# Altium schematic symbol library IC_ADI.SCHLIB: 3169 symbols (part 23 of 181)
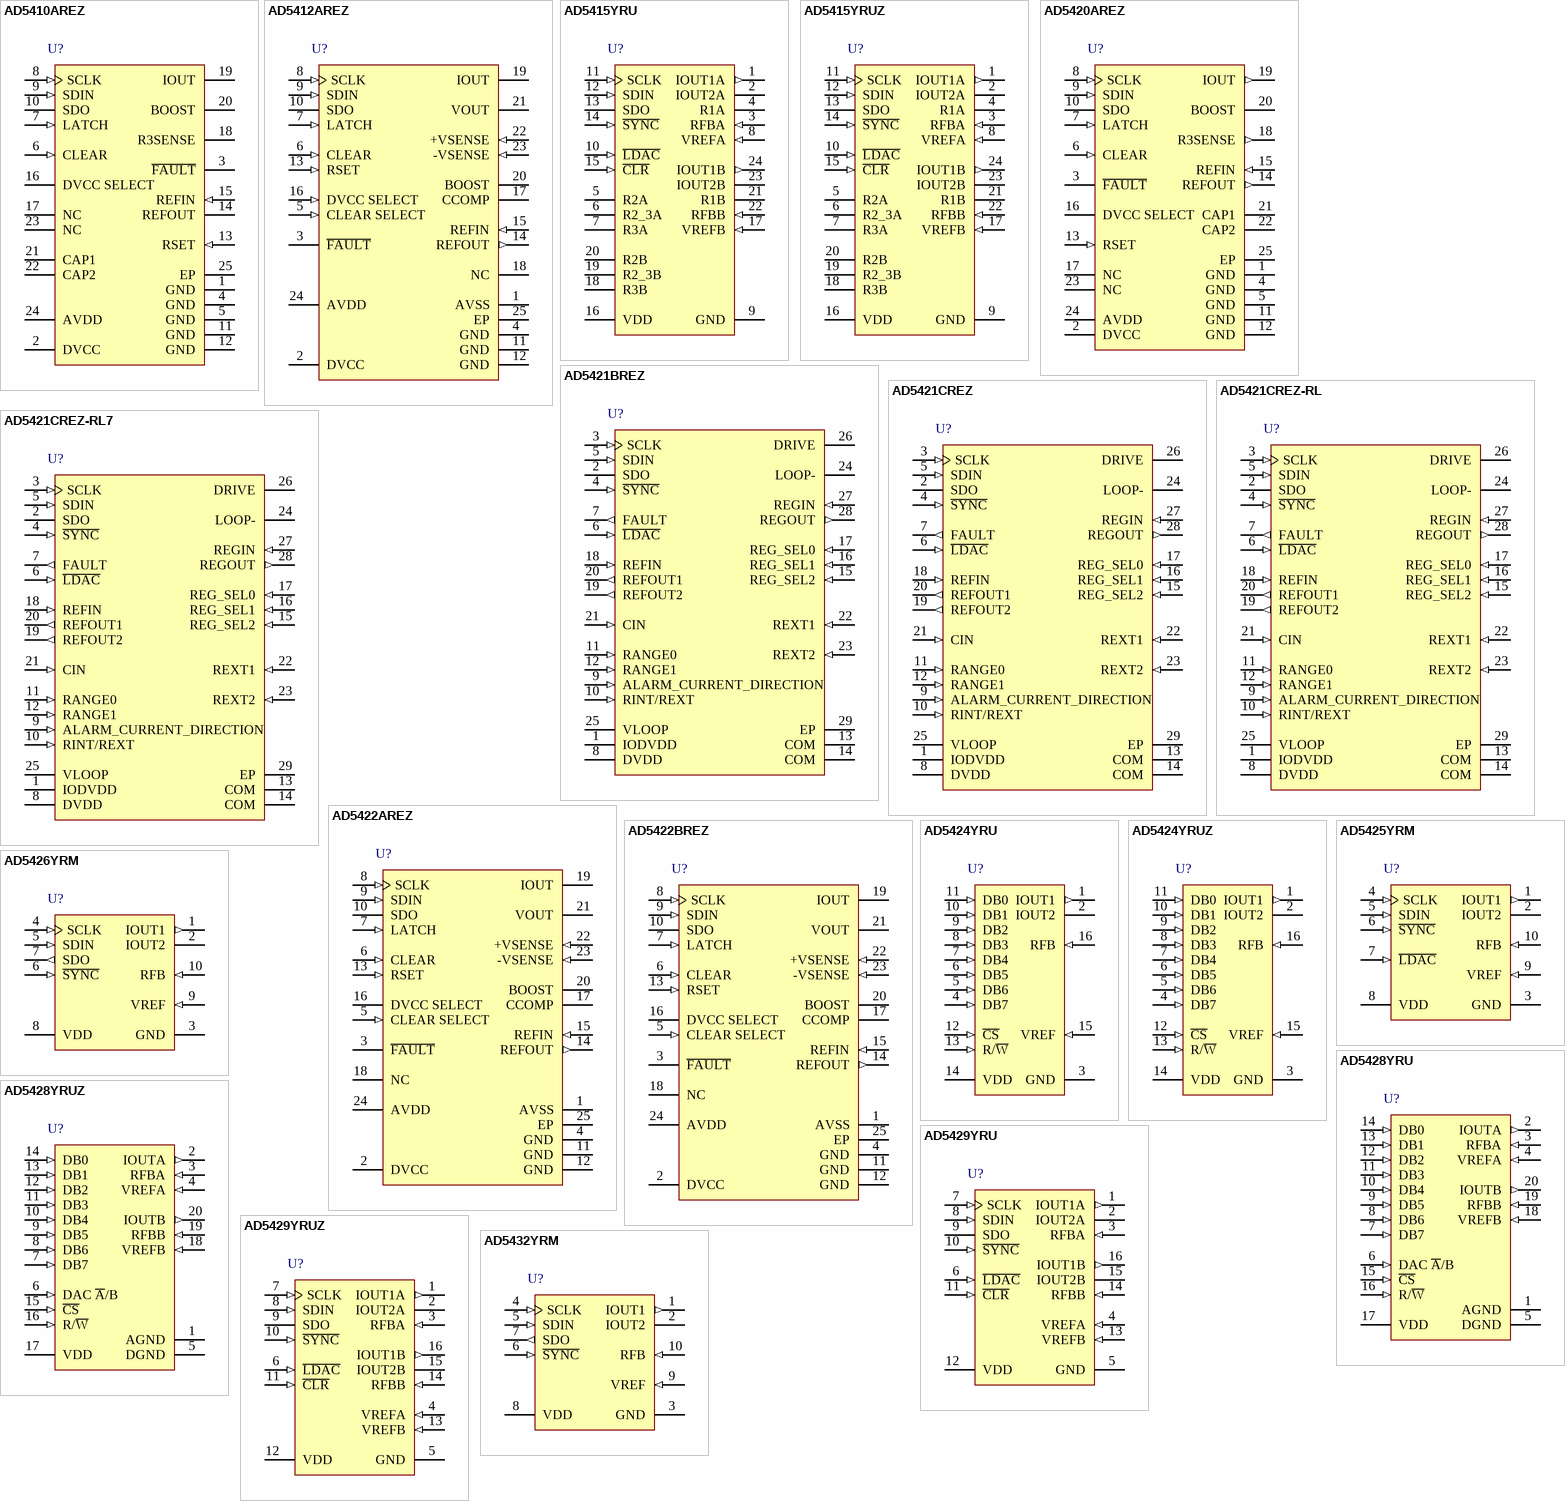
[diagram p213: symbols AD5410AREZ to AD5432YRM]

## AD5415YRU
designator U?
Dual 12-Bit High Bandwidth Multiplying Digital-to-Analog Converter, -40 to +125 degC, RU-24, Tube; Generic Part Number: AD5415; PartNumber: AD5415YRU; # DAC Outputs: 2; Max V+: 5.5V; Op Pwr Diss: 3.5礧; Resolution (Bits): 12; Settling Time: 120ns; Single Supply: Yes; DatasheetVersion: Rev. D; PackageVersion: 2002; PackageReference: RU-24; PackageDescription: 24-Lead Thin Shrink Small Outline Package [TSSOP]; Supplier Part Number 1: AD5415YRU-ND; Supplier Part Number 2: 584-AD5415YRU; Packing: Tube; RoHS: N; Mounting Technology: Surface Mount; Code_JEDEC: MO-153-AD; ComponentLink1Description: Manufacturer URL; ComponentLink2Description: Datasheet; ComponentLink3Description: Package Specification; ComponentLink4Description: Product URL
footprint TSSOP24_0.65 (Footprint not found)
pins: 1 IOUT1A (out) "DAC A Current Output.", 2 IOUT2A "DAC A Analog Ground. This pin should normally be tied to the analog ground of the system, but can be biased to achieve single-supply operation.", 3 RFBA (in) "DAC Feedback Resistor Pin. This pin establishes voltage output for the DAC by connecting to an external amplifier output.", 4 R1A "DAC A 4-Quadrant Resistors. These pins allow a number of configuration modes, including bipolar operation, with minimum external components.", 5 R2A "DAC A 4-Quadrant Resistors. These pins allow a number of configuration modes, including bipolar operation, with minimum external components.", 6 R2_3A "DAC A 4-Quadrant Resistors. These pins allow a number of configuration modes, including bipolar operation, with minimum external components.", 7 R3A "DAC A 4-Quadrant Resistors. These pins allow a number of configuration modes, including bipolar operation, with minimum external components.", 8 VREFA (in) "DAC A Reference Voltage Input Pin.", 9 GND (power) "Ground Pin.", 10 ~{LDAC} (in) "Load DAC Input. This pin allows asynchronous or synchronous updates to the DAC output. The DAC is asynchronously updated when this signal goes low. Alternatively, if this line is held permanently low, an automatic or (See Datasheet)", 11 SCLK (in) "Serial Clock Input. By default, data is clocked into the input shift register on the falling edge of the serial clock input. Alternatively, by means of the serial control bits, the device can be configured such that data is (See Datasheet)", 12 SDIN (in) "Serial Data Input. Data is clocked into the 16-bit input register on the active edge of the serial clock input. By default, on power-up data is clocked into the shift register on the falling edge of SCLK. The control bits (See Datasheet)", 13 SDO (oc) "Serial Data Output. This pin allows a number of parts to be daisy-chained. By default, data is clocked into the shift register on the falling edge and clocked out via SDO on the rising edge of SCLK. Data is always clocked (See Datasheet)", 14 ~{SYNC} (in) "Active Low Control Input. This pin provides the frame synchronization signal for the input data. When S\Y\N\C\ goes low, it powers on the SCLK and SDIN buffers, and the input shift register is enabled. Data is loaded into (See Datasheet)", 15 ~{CLR} (in) "Active Low Control Input. This pin clears the DAC output, input, and DAC registers. Configuration mode allows the user to enable the hardware C\L\R\ pin as a clear to zero scale or midscale as required.", 16 VDD (power) "Positive Power Supply Input. This part can be operated from a supply of 2.5 V to 5.5 V.", 17 VREFB (in) "DAC B Reference Voltage Input Pin.", 18 R3B "DAC B 4-Quadrant Resistors. These pins allow a number of configuration modes, including bipolar operation, with a minimum of external components.", 19 R2_3B "DAC B 4-Quadrant Resistors. These pins allow a number of configuration modes, including bipolar operation, with a minimum of external components.", 20 R2B "DAC B 4-Quadrant Resistors. These pins allow a number of configuration modes, including bipolar operation, with a minimum of external components.", 21 R1B "DAC B 4-Quadrant Resistors. These pins allow a number of configuration modes, including bipolar operation, with a minimum of external components.", 22 RFBB (in) "DAC B Feedback Resistor Pin. This pin establishes voltage output for the DAC by connecting to the external amplifier output.", 23 IOUT2B "DAC B Analog Ground. This pin should normally be tied to the analog ground of the system, but can be biased to achieve single-supply operation.", 24 IOUT1B (out) "DAC B Current Output."

## AD5415YRUZ
designator U?
Dual 12-Bit High Bandwidth Multiplying Digital-to-Analog Converter, -40 to +125 degC, RU-24, Pb-Free, Tube; Generic Part Number: AD5415; PartNumber: AD5415YRUZ; # DAC Outputs: 2; Max V+: 5.5V; Op Pwr Diss: 3.5礧; Resolution (Bits): 12; Settling Time: 120ns; Single Supply: Yes; DatasheetVersion: Rev. D; PackageVersion: 2002; PackageReference: RU-24; PackageDescription: 24-Lead Thin Shrink Small Outline Package [TSSOP]; Supplier Part Number 1: AD5415YRUZ-ND; Supplier Part Number 2: 59K4105; Supplier Part Number 3: 584-AD5415YRUZ; Packing: Tube; RoHS: Y; Mounting Technology: Surface Mount; Code_JEDEC: MO-153-AD; ComponentLink1Description: Manufacturer URL; ComponentLink2Description: Datasheet; ComponentLink3Description: Package Specification; ComponentLink4Description: Product URL
footprint TSSOP24_0.65 (Footprint not found)
pins: 1 IOUT1A (out) "DAC A Current Output.", 2 IOUT2A "DAC A Analog Ground. This pin should normally be tied to the analog ground of the system, but can be biased to achieve single-supply operation.", 3 RFBA (in) "DAC Feedback Resistor Pin. This pin establishes voltage output for the DAC by connecting to an external amplifier output.", 4 R1A "DAC A 4-Quadrant Resistors. These pins allow a number of configuration modes, including bipolar operation, with minimum external components.", 5 R2A "DAC A 4-Quadrant Resistors. These pins allow a number of configuration modes, including bipolar operation, with minimum external components.", 6 R2_3A "DAC A 4-Quadrant Resistors. These pins allow a number of configuration modes, including bipolar operation, with minimum external components.", 7 R3A "DAC A 4-Quadrant Resistors. These pins allow a number of configuration modes, including bipolar operation, with minimum external components.", 8 VREFA (in) "DAC A Reference Voltage Input Pin.", 9 GND (power) "Ground Pin.", 10 ~{LDAC} (in) "Load DAC Input. This pin allows asynchronous or synchronous updates to the DAC output. The DAC is asynchronously updated when this signal goes low. Alternatively, if this line is held permanently low, an automatic or (See Datasheet)", 11 SCLK (in) "Serial Clock Input. By default, data is clocked into the input shift register on the falling edge of the serial clock input. Alternatively, by means of the serial control bits, the device can be configured such that data is (See Datasheet)", 12 SDIN (in) "Serial Data Input. Data is clocked into the 16-bit input register on the active edge of the serial clock input. By default, on power-up data is clocked into the shift register on the falling edge of SCLK. The control bits (See Datasheet)", 13 SDO (oc) "Serial Data Output. This pin allows a number of parts to be daisy-chained. By default, data is clocked into the shift register on the falling edge and clocked out via SDO on the rising edge of SCLK. Data is always clocked (See Datasheet)", 14 ~{SYNC} (in) "Active Low Control Input. This pin provides the frame synchronization signal for the input data. When S\Y\N\C\ goes low, it powers on the SCLK and SDIN buffers, and the input shift register is enabled. Data is loaded into (See Datasheet)", 15 ~{CLR} (in) "Active Low Control Input. This pin clears the DAC output, input, and DAC registers. Configuration mode allows the user to enable the hardware C\L\R\ pin as a clear to zero scale or midscale as required.", 16 VDD (power) "Positive Power Supply Input. This part can be operated from a supply of 2.5 V to 5.5 V.", 17 VREFB (in) "DAC B Reference Voltage Input Pin.", 18 R3B "DAC B 4-Quadrant Resistors. These pins allow a number of configuration modes, including bipolar operation, with a minimum of external components.", 19 R2_3B "DAC B 4-Quadrant Resistors. These pins allow a number of configuration modes, including bipolar operation, with a minimum of external components.", 20 R2B "DAC B 4-Quadrant Resistors. These pins allow a number of configuration modes, including bipolar operation, with a minimum of external components.", 21 R1B "DAC B 4-Quadrant Resistors. These pins allow a number of configuration modes, including bipolar operation, with a minimum of external components.", 22 RFBB (in) "DAC B Feedback Resistor Pin. This pin establishes voltage output for the DAC by connecting to the external amplifier output.", 23 IOUT2B "DAC B Analog Ground. This pin should normally be tied to the analog ground of the system, but can be biased to achieve single-supply operation.", 24 IOUT1B (out) "DAC B Current Output."

## AD5420AREZ
designator U?
Single 16-Bit Current Source Digital-to-Analog Converter with Serial Interface and HART Connectivity, 4 to 20 mA, -40 to +85 degC, RE-24, Pb-Free, Tube; Generic Part Number: AD5420; PartNumber: AD5420AREZ; # DAC Outputs: 1; Max V+: 60V; Resolution (Bits): 16; DatasheetVersion: Rev.D; PackageVersion: 050806-A; PackageReference: RE-24; PackageDescription: 24-Lead Thin Shrink Small Outline Package, Exposed Pad [TSSOP_EP]; Supplier Part Number 1: AD5420AREZ-ND; Supplier Part Number 2: 1827276; Supplier Part Number 3: 05R6577; Supplier Part Number 4: 584-AD5420AREZ; Packing: Tube; RoHS: Y; Mounting Technology: Surface Mount; Code_JEDEC: MO-153-ADT; ComponentLink1Description: Manufacturer URL; ComponentLink2Description: Datasheet; ComponentLink3Description: Package Specification; ComponentLink4Description: Product URL; ComponentLink5Description: Reference Design URL
footprint TSSOP24_0.65-PAD (Footprint not found)
pins: 1 GND (power) "These pins must be connected to ground.", 2 DVCC (power) "Digital Supply Pin. Voltage ranges from 2.7 V to 5.5 V.", 3 ~{FAULT} (oc) "Fault Alert. This pin is asserted low when an open circuit is detected between IOUT and GND or an overtemperature is detected. The F\A\U\L\T\ pin is an open-drain output and must be connected to DVCC through a pull-up (See Datasheet)", 4 GND (power) "These pins must be connected to ground.", 5 GND (power) "These pins must be connected to ground.", 6 CLEAR (in) "Active High Input. Asserting this pin sets the output current to the zero-scale value, which is either 0 mA or 4 mA, depending on the output range programmed, that is, 0 mA to 20 mA, 0 mA to 24 mA, or 4 mA to 20 mA.", 7 LATCH (in) "Positive Edge Sensitive Latch. A rising edge parallel loads the input shift register data into the relevant register. In the case of the data register, the output current is also updated.", 8 SCLK (in) "Serial Clock Input. Data is clocked into the input shift register on the rising edge of SCLK. This operates at clock speeds of up to 30 MHz.", 9 SDIN (in) "Serial Data Input. Data must be valid on the rising edge of SCLK.", 10 SDO (hiz) "Serial Data Output. This pin is used to clock data from the device in daisy-chain or readback mode. Data is clocked out on the falling edge of SCLK. See Figure 3 and Figure 4.", 11 GND (power) "Ground Reference Pin.", 12 GND (power) "These pins must be connected to ground.", 13 RSET (in) "An external, precision, low drift 15 k ohm current setting resistor can be connected to this pin to improve the overall performance of the device. See the Specifications and AD5420 Features sections.", 14 REFOUT (out) "Internal Reference Voltage Output. VREFOUT = 5 V +/- 5 mV at TA = 25degC. Typical temperature drift is 1.8 ppm/degC.", 15 REFIN (in) "External Reference Voltage Input. VREFIN = 5 V +/- 50 mV for specified performance.", 16 DVCC SELECT "This pin, when connected to GND, disables the internal supply, and an external supply must be connected to the DVCC pin. Leave this pin unconnected to enable the internal supply. See the AD5420 Features section.", 17 NC "Do not connect to these pins.", 18 R3SENSE (out) "The voltage measured between this pin and the BOOST pin is directly proportional to the output current and can be used as a monitor/feedback feature. This should be used as a voltage sense output only; current should not be (See Datasheet)", 19 IOUT (out) "Current Output Pin.", 20 BOOST "Optional External Transistor Connection. Connecting an external transistor reduces the power dissipated in the AD5420. See the AD5420 Features section.", 21 CAP1 "Connection for Optional Output Filtering Capacitor. See the AD5420 Features section.", 22 CAP2 "Connection for Optional Output Filtering Capacitor. See the AD5420 Features section. Also HART Input Connection, see Device Features Section.", 23 NC "Do not connect to these pins.", 24 AVDD (power) "Positive Analog Supply Pin. Voltage ranges from 10.8 V to 40 V.", 25 EP (power) "Ground Reference Connection. It is recommended that the exposed pad be thermally connected to a copper plane for enhanced thermal performance."

## AD5421BREZ
designator U?
Single 16-Bit Loop-Powered Digital-to-Analog Converter with Serial Interface, 4 to 20 mA, -40 to +105 degC, RE-28-2, Pb-Free, Tube; Generic Part Number: AD5421; PartNumber: AD5421BREZ; # DAC Outputs: 1; Max V+: 52V; Op Pwr Diss: 1.43mW; Resolution (Bits): 16; Settling Time: 50祍; Single Supply: Yes; DatasheetVersion: Rev.D; PackageVersion: May-2006; PackageReference: RE-28-2; PackageDescription: 28-Lead Thin Shrink Small Outline with Exposed Pad [TSSOP_EP]; Supplier Part Number 1: AD5421BREZ-ND; Supplier Part Number 2: 2081038; Supplier Part Number 3: 27T3838; Supplier Part Number 4: 83T2171; Supplier Part Number 5: 584-AD5421BREZ; Packing: Tube; RoHS: Y; Mounting Technology: Surface Mount; Code_JEDEC: MO-153-AET; ComponentLink1Description: Manufacturer URL; ComponentLink2Description: Datasheet; ComponentLink3Description: Package Specification; ComponentLink4Description: Product URL
footprint TSSOP28_0.65-PAD (Footprint not found)
pins: 1 IODVDD (power) "Digital Interface Supply Pin. Digital thresholds are referenced to the voltage applied to this pin. A voltage from 1.71 V to 5.5 V can be applied to this pin.", 2 SDO (hiz) "Serial Data Output. Used to clock data from the input shift register. Data is clocked out on the rising edge of SCLK and is valid on the falling edge of SCLK.", 3 SCLK (in) "Serial Clock Input. Data is clocked into the input shift register on the falling edge of SCLK. This input operates at clock speeds up to 30 MHz.", 4 ~{SYNC} (in) "Frame Synchronization Input, Active Low. This is the frame synchronization signal for the serial interface. When S\Y\N\C\ is low, data is transferred on the falling edge of SCLK. The input shift register data is latched on (See Datasheet)", 5 SDIN (in) "Serial Data Input. Data must be valid on the falling edge of SCLK.", 6 ~{LDAC} (in) "Load DAC Input, Active Low. This pin is used to update the DAC register and, consequently, the output current. If L\D\A\C\ is tied permanently low, the DAC register is updated on the rising edge of S\Y\N\C\. If L\D\A\C\ is (See Datasheet)", 7 FAULT (out) "Fault Alert Output Pin, Active High. This pin is asserted high when a fault is detected. Detectable faults are loss of SPI interface control, communication error (PEC), loop current out of range, insufficient loop voltage, (See Datasheet)", 8 DVDD (power) "3.3 V Digital Power Supply Output. This pin should be decoupled to COM with 100 nF and 4.7 uF capacitors.", 9 ALARM_CURRENT_DIRECTION (in) "Alarm Current Direction Select. This pin is used to select whether the alarm current is upscale (22.8 mA/24 mA) or downscale (3.2 mA). Connecting this pin to DVDD selects an upscale alarm current (22.8 mA/24 mA); connecting (See Datasheet)", 10 RINT/REXT (in) "Current Setting Resistor Select. When this pin is connected to DVDD, the internal current setting resistor is selected. When this pin is connected to COM, the external current setting resistor is selected. An external (See Datasheet)", 11 RANGE0 (in) "Digital Input Pins. These two pins select the loop current range (see the Loop Current Range Selection section).", 12 RANGE1 (in) "Digital Input Pins. These two pins select the loop current range (see the Loop Current Range Selection section).", 13 COM (power) "Ground Reference Pin for the AD5421. It is recommended that a 4.7 V Zener diode be placed between the LOOP- and COM pins. See the Applications Information section for more information.", 14 COM (power) "Ground Reference Pin for the AD5421. It is recommended that a 4.7 V Zener diode be placed between the LOOP- and COM pins. See the Applications Information section for more information.", 15 REG_SEL2 (in) "These three pins together select the regulator output (REGOUT) voltage (see the Voltage Regulator section).", 16 REG_SEL1 (in) "These three pins together select the regulator output (REGOUT) voltage (see the Voltage Regulator section).", 17 REG_SEL0 (in) "These three pins together select the regulator output (REGOUT) voltage (see the Voltage Regulator section).", 18 REFIN (in) "Reference Voltage Input. VREFIN = 2.5 V for specified performance.", 19 REFOUT2 (out) "Internal Reference Voltage Output (1.22 V). It is recommended to connect a 100 nF capacitor from this pin to COM.", 20 REFOUT1 (out) "Internal Reference Voltage Output (2.5 V). It is recommended to connect a 100 nF capacitor from this pin to COM.", 21 CIN (in) "External Capacitor Connection and HART FSK Input. An external capacitor connected from CIN to COM implements an output slew rate control function (see the Loop Current Slew Rate Control section). HART FSK signaling can also (See Datasheet)", 22 REXT1 (in) "Connection for External Current Setting Resistor. A precision 24 k ohm resistor can be connected between these pins for improved performance.", 23 REXT2 (in) "Connection for External Current Setting Resistor. A precision 24 k ohm resistor can be connected between these pins for improved performance.", 24 LOOP- "Loop Current Return Pin.", 25 VLOOP (power) "Voltage Input Pin. Voltage input range is 0 V to 2.5 V. The voltage applied to this pin is digitized to eight bits, which are available in the fault register. This pin can be used for general-purpose voltage monitoring, but (See Datasheet)", 26 DRIVE "Gate Connection for External Depletion Mode MOSFET. For more information, see the Connection to Loop Power Supply section.", 27 REGIN (in) "Voltage Regulator Input. The loop voltage can be connected directly to this pin. Or, to reduce on-chip power dissipation, an external pass transistor can be connected at this pin to stand off the loop voltage. For more (See Datasheet)", 28 REGOUT (out) "Voltage Regulator Output. Pin selectable values are from 1.8 V to 12 V via the REG_SEL0, REG_SEL1, and REG_SEL2 pins (see the Voltage Regulator section).", 29 EP (power) "The exposed paddle should be connected to the same potential as the COM pin and to a copper plane for optimum thermal performance."

## AD5421CREZ
designator U?
Single 16-Bit Loop-Powered Digital-to-Analog Converter with Serial Interface, 4 to 20 mA, -40 to +105 degC, RE-28-2, Pb-Free, Tube; Generic Part Number: AD5421; PartNumber: AD5421CREZ; # DAC Outputs: 1; Max V+: 52V; Op Pwr Diss: 1.43mW; Resolution (Bits): 16; Settling Time: 50祍; Single Supply: Yes; DatasheetVersion: Rev.D; PackageVersion: May-2006; PackageReference: RE-28-2; PackageDescription: 28-Lead Thin Shrink Small Outline with Exposed Pad [TSSOP_EP]; Supplier Part Number 1: AD5421CREZ-ND; Supplier Part Number 2: 2081037; Supplier Part Number 3: 39T6553; Supplier Part Number 4: 83T2172; Supplier Part Number 5: 584-AD5421CREZ; Packing: Tube; RoHS: Y; Mounting Technology: Surface Mount; Code_JEDEC: MO-153-AET; ComponentLink1Description: Manufacturer URL; ComponentLink2Description: Datasheet; ComponentLink3Description: Package Specification; ComponentLink4Description: Product URL
footprint TSSOP28_0.65-PAD (Footprint not found)
pins: 1 IODVDD (power) "Digital Interface Supply Pin. Digital thresholds are referenced to the voltage applied to this pin. A voltage from 1.71 V to 5.5 V can be applied to this pin.", 2 SDO (hiz) "Serial Data Output. Used to clock data from the input shift register. Data is clocked out on the rising edge of SCLK and is valid on the falling edge of SCLK.", 3 SCLK (in) "Serial Clock Input. Data is clocked into the input shift register on the falling edge of SCLK. This input operates at clock speeds up to 30 MHz.", 4 ~{SYNC} (in) "Frame Synchronization Input, Active Low. This is the frame synchronization signal for the serial interface. When S\Y\N\C\ is low, data is transferred on the falling edge of SCLK. The input shift register data is latched on (See Datasheet)", 5 SDIN (in) "Serial Data Input. Data must be valid on the falling edge of SCLK.", 6 ~{LDAC} (in) "Load DAC Input, Active Low. This pin is used to update the DAC register and, consequently, the output current. If L\D\A\C\ is tied permanently low, the DAC register is updated on the rising edge of S\Y\N\C\. If L\D\A\C\ is (See Datasheet)", 7 FAULT (out) "Fault Alert Output Pin, Active High. This pin is asserted high when a fault is detected. Detectable faults are loss of SPI interface control, communication error (PEC), loop current out of range, insufficient loop voltage, (See Datasheet)", 8 DVDD (power) "3.3 V Digital Power Supply Output. This pin should be decoupled to COM with 100 nF and 4.7 uF capacitors.", 9 ALARM_CURRENT_DIRECTION (in) "Alarm Current Direction Select. This pin is used to select whether the alarm current is upscale (22.8 mA/24 mA) or downscale (3.2 mA). Connecting this pin to DVDD selects an upscale alarm current (22.8 mA/24 mA); connecting (See Datasheet)", 10 RINT/REXT (in) "Current Setting Resistor Select. When this pin is connected to DVDD, the internal current setting resistor is selected. When this pin is connected to COM, the external current setting resistor is selected. An external (See Datasheet)", 11 RANGE0 (in) "Digital Input Pins. These two pins select the loop current range (see the Loop Current Range Selection section).", 12 RANGE1 (in) "Digital Input Pins. These two pins select the loop current range (see the Loop Current Range Selection section).", 13 COM (power) "Ground Reference Pin for the AD5421. It is recommended that a 4.7 V Zener diode be placed between the LOOP- and COM pins. See the Applications Information section for more information.", 14 COM (power) "Ground Reference Pin for the AD5421. It is recommended that a 4.7 V Zener diode be placed between the LOOP- and COM pins. See the Applications Information section for more information.", 15 REG_SEL2 (in) "These three pins together select the regulator output (REGOUT) voltage (see the Voltage Regulator section).", 16 REG_SEL1 (in) "These three pins together select the regulator output (REGOUT) voltage (see the Voltage Regulator section).", 17 REG_SEL0 (in) "These three pins together select the regulator output (REGOUT) voltage (see the Voltage Regulator section).", 18 REFIN (in) "Reference Voltage Input. VREFIN = 2.5 V for specified performance.", 19 REFOUT2 (out) "Internal Reference Voltage Output (1.22 V). It is recommended to connect a 100 nF capacitor from this pin to COM.", 20 REFOUT1 (out) "Internal Reference Voltage Output (2.5 V). It is recommended to connect a 100 nF capacitor from this pin to COM.", 21 CIN (in) "External Capacitor Connection and HART FSK Input. An external capacitor connected from CIN to COM implements an output slew rate control function (see the Loop Current Slew Rate Control section). HART FSK signaling can also (See Datasheet)", 22 REXT1 (in) "Connection for External Current Setting Resistor. A precision 24 k ohm resistor can be connected between these pins for improved performance.", 23 REXT2 (in) "Connection for External Current Setting Resistor. A precision 24 k ohm resistor can be connected between these pins for improved performance.", 24 LOOP- "Loop Current Return Pin.", 25 VLOOP (power) "Voltage Input Pin. Voltage input range is 0 V to 2.5 V. The voltage applied to this pin is digitized to eight bits, which are available in the fault register. This pin can be used for general-purpose voltage monitoring, but (See Datasheet)", 26 DRIVE "Gate Connection for External Depletion Mode MOSFET. For more information, see the Connection to Loop Power Supply section.", 27 REGIN (in) "Voltage Regulator Input. The loop voltage can be connected directly to this pin. Or, to reduce on-chip power dissipation, an external pass transistor can be connected at this pin to stand off the loop voltage. For more (See Datasheet)", 28 REGOUT (out) "Voltage Regulator Output. Pin selectable values are from 1.8 V to 12 V via the REG_SEL0, REG_SEL1, and REG_SEL2 pins (see the Voltage Regulator section).", 29 EP (power) "The exposed paddle should be connected to the same potential as the COM pin and to a copper plane for optimum thermal performance."

## AD5421CREZ-RL
designator U?
Single 16-Bit Loop-Powered Digital-to-Analog Converter with Serial Interface, 4 to 20 mA, -40 to +105 degC, RE-28-2, Pb-Free, Reel; Generic Part Number: AD5421; PartNumber: AD5421CREZ-RL; # DAC Outputs: 1; Max V+: 52V; Op Pwr Diss: 1.43mW; Resolution (Bits): 16; Settling Time: 50祍; Single Supply: Yes; DatasheetVersion: Rev.D; PackageVersion: May-2006; PackageReference: RE-28-2; PackageDescription: 28-Lead Thin Shrink Small Outline with Exposed Pad [TSSOP_EP]; Supplier Part Number 1: AD5421CREZ-RL-ND; Supplier Part Number 2: 584-AD5421CREZ-R; Packing: Reel; RoHS: Y; Mounting Technology: Surface Mount; Code_JEDEC: MO-153-AET; ComponentLink1Description: Manufacturer URL; ComponentLink2Description: Datasheet; ComponentLink3Description: Package Specification; ComponentLink4Description: Product URL
footprint TSSOP28_0.65-PAD (Footprint not found)
pins: 1 IODVDD (power) "Digital Interface Supply Pin. Digital thresholds are referenced to the voltage applied to this pin. A voltage from 1.71 V to 5.5 V can be applied to this pin.", 2 SDO (hiz) "Serial Data Output. Used to clock data from the input shift register. Data is clocked out on the rising edge of SCLK and is valid on the falling edge of SCLK.", 3 SCLK (in) "Serial Clock Input. Data is clocked into the input shift register on the falling edge of SCLK. This input operates at clock speeds up to 30 MHz.", 4 ~{SYNC} (in) "Frame Synchronization Input, Active Low. This is the frame synchronization signal for the serial interface. When S\Y\N\C\ is low, data is transferred on the falling edge of SCLK. The input shift register data is latched on (See Datasheet)", 5 SDIN (in) "Serial Data Input. Data must be valid on the falling edge of SCLK.", 6 ~{LDAC} (in) "Load DAC Input, Active Low. This pin is used to update the DAC register and, consequently, the output current. If L\D\A\C\ is tied permanently low, the DAC register is updated on the rising edge of S\Y\N\C\. If L\D\A\C\ is (See Datasheet)", 7 FAULT (out) "Fault Alert Output Pin, Active High. This pin is asserted high when a fault is detected. Detectable faults are loss of SPI interface control, communication error (PEC), loop current out of range, insufficient loop voltage, (See Datasheet)", 8 DVDD (power) "3.3 V Digital Power Supply Output. This pin should be decoupled to COM with 100 nF and 4.7 uF capacitors.", 9 ALARM_CURRENT_DIRECTION (in) "Alarm Current Direction Select. This pin is used to select whether the alarm current is upscale (22.8 mA/24 mA) or downscale (3.2 mA). Connecting this pin to DVDD selects an upscale alarm current (22.8 mA/24 mA); connecting (See Datasheet)", 10 RINT/REXT (in) "Current Setting Resistor Select. When this pin is connected to DVDD, the internal current setting resistor is selected. When this pin is connected to COM, the external current setting resistor is selected. An external (See Datasheet)", 11 RANGE0 (in) "Digital Input Pins. These two pins select the loop current range (see the Loop Current Range Selection section).", 12 RANGE1 (in) "Digital Input Pins. These two pins select the loop current range (see the Loop Current Range Selection section).", 13 COM (power) "Ground Reference Pin for the AD5421. It is recommended that a 4.7 V Zener diode be placed between the LOOP- and COM pins. See the Applications Information section for more information.", 14 COM (power) "Ground Reference Pin for the AD5421. It is recommended that a 4.7 V Zener diode be placed between the LOOP- and COM pins. See the Applications Information section for more information.", 15 REG_SEL2 (in) "These three pins together select the regulator output (REGOUT) voltage (see the Voltage Regulator section).", 16 REG_SEL1 (in) "These three pins together select the regulator output (REGOUT) voltage (see the Voltage Regulator section).", 17 REG_SEL0 (in) "These three pins together select the regulator output (REGOUT) voltage (see the Voltage Regulator section).", 18 REFIN (in) "Reference Voltage Input. VREFIN = 2.5 V for specified performance.", 19 REFOUT2 (out) "Internal Reference Voltage Output (1.22 V). It is recommended to connect a 100 nF capacitor from this pin to COM.", 20 REFOUT1 (out) "Internal Reference Voltage Output (2.5 V). It is recommended to connect a 100 nF capacitor from this pin to COM.", 21 CIN (in) "External Capacitor Connection and HART FSK Input. An external capacitor connected from CIN to COM implements an output slew rate control function (see the Loop Current Slew Rate Control section). HART FSK signaling can also (See Datasheet)", 22 REXT1 (in) "Connection for External Current Setting Resistor. A precision 24 k ohm resistor can be connected between these pins for improved performance.", 23 REXT2 (in) "Connection for External Current Setting Resistor. A precision 24 k ohm resistor can be connected between these pins for improved performance.", 24 LOOP- "Loop Current Return Pin.", 25 VLOOP (power) "Voltage Input Pin. Voltage input range is 0 V to 2.5 V. The voltage applied to this pin is digitized to eight bits, which are available in the fault register. This pin can be used for general-purpose voltage monitoring, but (See Datasheet)", 26 DRIVE "Gate Connection for External Depletion Mode MOSFET. For more information, see the Connection to Loop Power Supply section.", 27 REGIN (in) "Voltage Regulator Input. The loop voltage can be connected directly to this pin. Or, to reduce on-chip power dissipation, an external pass transistor can be connected at this pin to stand off the loop voltage. For more (See Datasheet)", 28 REGOUT (out) "Voltage Regulator Output. Pin selectable values are from 1.8 V to 12 V via the REG_SEL0, REG_SEL1, and REG_SEL2 pins (see the Voltage Regulator section).", 29 EP (power) "The exposed paddle should be connected to the same potential as the COM pin and to a copper plane for optimum thermal performance."

## AD5421CREZ-RL7
designator U?
Single 16-Bit Loop-Powered Digital-to-Analog Converter with Serial Interface, 4 to 20 mA, -40 to +105 degC, RE-28-2, Pb-Free, Reel; Generic Part Number: AD5421; PartNumber: AD5421CREZ-RL7; # DAC Outputs: 1; Max V+: 52V; Op Pwr Diss: 1.43mW; Resolution (Bits): 16; Settling Time: 50祍; Single Supply: Yes; DatasheetVersion: Rev.D; PackageVersion: May-2006; PackageReference: RE-28-2; PackageDescription: 28-Lead Thin Shrink Small Outline with Exposed Pad [TSSOP_EP]; Supplier Part Number 1: AD5421CREZ-RL7-ND; Supplier Part Number 2: 584-AD5421CREZ-R7; Packing: Reel; RoHS: Y; Mounting Technology: Surface Mount; Code_JEDEC: MO-153-AET; ComponentLink1Description: Manufacturer URL; ComponentLink2Description: Datasheet; ComponentLink3Description: Package Specification; ComponentLink4Description: Product URL
footprint TSSOP28_0.65-PAD (Footprint not found)
pins: 1 IODVDD (power) "Digital Interface Supply Pin. Digital thresholds are referenced to the voltage applied to this pin. A voltage from 1.71 V to 5.5 V can be applied to this pin.", 2 SDO (hiz) "Serial Data Output. Used to clock data from the input shift register. Data is clocked out on the rising edge of SCLK and is valid on the falling edge of SCLK.", 3 SCLK (in) "Serial Clock Input. Data is clocked into the input shift register on the falling edge of SCLK. This input operates at clock speeds up to 30 MHz.", 4 ~{SYNC} (in) "Frame Synchronization Input, Active Low. This is the frame synchronization signal for the serial interface. When S\Y\N\C\ is low, data is transferred on the falling edge of SCLK. The input shift register data is latched on (See Datasheet)", 5 SDIN (in) "Serial Data Input. Data must be valid on the falling edge of SCLK.", 6 ~{LDAC} (in) "Load DAC Input, Active Low. This pin is used to update the DAC register and, consequently, the output current. If L\D\A\C\ is tied permanently low, the DAC register is updated on the rising edge of S\Y\N\C\. If L\D\A\C\ is (See Datasheet)", 7 FAULT (out) "Fault Alert Output Pin, Active High. This pin is asserted high when a fault is detected. Detectable faults are loss of SPI interface control, communication error (PEC), loop current out of range, insufficient loop voltage, (See Datasheet)", 8 DVDD (power) "3.3 V Digital Power Supply Output. This pin should be decoupled to COM with 100 nF and 4.7 uF capacitors.", 9 ALARM_CURRENT_DIRECTION (in) "Alarm Current Direction Select. This pin is used to select whether the alarm current is upscale (22.8 mA/24 mA) or downscale (3.2 mA). Connecting this pin to DVDD selects an upscale alarm current (22.8 mA/24 mA); connecting (See Datasheet)", 10 RINT/REXT (in) "Current Setting Resistor Select. When this pin is connected to DVDD, the internal current setting resistor is selected. When this pin is connected to COM, the external current setting resistor is selected. An external (See Datasheet)", 11 RANGE0 (in) "Digital Input Pins. These two pins select the loop current range (see the Loop Current Range Selection section).", 12 RANGE1 (in) "Digital Input Pins. These two pins select the loop current range (see the Loop Current Range Selection section).", 13 COM (power) "Ground Reference Pin for the AD5421. It is recommended that a 4.7 V Zener diode be placed between the LOOP- and COM pins. See the Applications Information section for more information.", 14 COM (power) "Ground Reference Pin for the AD5421. It is recommended that a 4.7 V Zener diode be placed between the LOOP- and COM pins. See the Applications Information section for more information.", 15 REG_SEL2 (in) "These three pins together select the regulator output (REGOUT) voltage (see the Voltage Regulator section).", 16 REG_SEL1 (in) "These three pins together select the regulator output (REGOUT) voltage (see the Voltage Regulator section).", 17 REG_SEL0 (in) "These three pins together select the regulator output (REGOUT) voltage (see the Voltage Regulator section).", 18 REFIN (in) "Reference Voltage Input. VREFIN = 2.5 V for specified performance.", 19 REFOUT2 (out) "Internal Reference Voltage Output (1.22 V). It is recommended to connect a 100 nF capacitor from this pin to COM.", 20 REFOUT1 (out) "Internal Reference Voltage Output (2.5 V). It is recommended to connect a 100 nF capacitor from this pin to COM.", 21 CIN (in) "External Capacitor Connection and HART FSK Input. An external capacitor connected from CIN to COM implements an output slew rate control function (see the Loop Current Slew Rate Control section). HART FSK signaling can also (See Datasheet)", 22 REXT1 (in) "Connection for External Current Setting Resistor. A precision 24 k ohm resistor can be connected between these pins for improved performance.", 23 REXT2 (in) "Connection for External Current Setting Resistor. A precision 24 k ohm resistor can be connected between these pins for improved performance.", 24 LOOP- "Loop Current Return Pin.", 25 VLOOP (power) "Voltage Input Pin. Voltage input range is 0 V to 2.5 V. The voltage applied to this pin is digitized to eight bits, which are available in the fault register. This pin can be used for general-purpose voltage monitoring, but (See Datasheet)", 26 DRIVE "Gate Connection for External Depletion Mode MOSFET. For more information, see the Connection to Loop Power Supply section.", 27 REGIN (in) "Voltage Regulator Input. The loop voltage can be connected directly to this pin. Or, to reduce on-chip power dissipation, an external pass transistor can be connected at this pin to stand off the loop voltage. For more (See Datasheet)", 28 REGOUT (out) "Voltage Regulator Output. Pin selectable values are from 1.8 V to 12 V via the REG_SEL0, REG_SEL1, and REG_SEL2 pins (see the Voltage Regulator section).", 29 EP (power) "The exposed paddle should be connected to the same potential as the COM pin and to a copper plane for optimum thermal performance."

## AD5422AREZ
designator U?
Single 16-Bit Current Source Digital-to-Analog Converter with Serial Interface and HART Connectivity, -40 to +85 degC, RE-24, Pb-Free, Tube; Generic Part Number: AD5422; PartNumber: AD5422AREZ; # DAC Outputs: 1; Max V+: 40V; Op Pwr Diss: 158mW; Resolution (Bits): 16; Settling Time: 18祍; Single Supply: No; DatasheetVersion: Rev.E; PackageVersion: 050806-A; PackageReference: RE-24; PackageDescription: 24-Lead Thin Shrink Small Outline Package, Exposed Pad [TSSOP_EP]; Supplier Part Number 1: AD5422AREZ-ND; Supplier Part Number 2: 1827278; Supplier Part Number 3: 51R0712; Supplier Part Number 4: 584-AD5422AREZ; Packing: Tube; RoHS: Y; Mounting Technology: Surface Mount; Code_JEDEC: MO-153-ADT; ComponentLink1Description: Manufacturer URL; ComponentLink2Description: Datasheet; ComponentLink3Description: Package Specification; ComponentLink4Description: Product URL; ComponentLink5Description: Reference Design URL
footprint TSSOP24_0.65-PAD (Footprint not found)
pins: 1 AVSS (power) "Negative Analog Supply Pin. Voltage ranges from -3 V to -24 V. This pin can be connected to 0 V if the output voltage range is unipolar.", 2 DVCC (power) "Digital Supply Pin. Voltage ranges from 2.7 V to 5.5 V.This pin can also be configured as a 4.5 V LDO output by leaving the DVCC SELECT pin floating.", 3 ~{FAULT} (oc) "Fault Alert. This pin is asserted low when an open circuit is detected in current mode or an overtemperature is detected. Open drain output must be connected to a pull-up resistor.", 4 GND (power) "This pin must be connected to 0 V.", 5 CLEAR SELECT (in) "Selects the voltage output clear value, either zero-scale or midscale code (see Table 21).", 6 CLEAR (in) "Active High Input. Asserting this pin sets the current output to the bottom of the selected range or sets the voltage output to the user selected value (zero-scale or midscale).", 7 LATCH (in) "Positive Edge Sensitive Latch. A rising LATCH edge parallel loads the input shift register data into the DAC register, also updating the output.", 8 SCLK (in) "Serial Clock Input. Data is clocked into the shift register on the rising edge of SCLK. This operates at clock speeds of up to 30 MHz.", 9 SDIN (in) "Serial Data Input. Data must be valid on the rising edge of SCLK.", 10 SDO (hiz) "Serial Data Output. Used to clock data from the serial register in daisy-chain or readback mode. Data is valid on the rising edge of SCLK (see Figure 3 and Figure 4).", 11 GND (power) "Ground Reference Pin.", 12 GND (power) "This pin must be connected to 0 V.", 13 RSET (in) "An external, precision, low drift 15 kohm current setting resistor can be connected to this pin to improve the IOUT temperature drift performance. See the AD5422 Features section.", 14 REFOUT (out) "Internal Reference Voltage Output. REFOUT = 5 V +/- 2 mV.", 15 REFIN (in) "External Reference Voltage Input. Reference input range is 4 V to 5 V. REFIN = 5 V for a specified performance.", 16 DVCC SELECT "When connected to GND, this pin disables the internal supply, and an external supply must be connected to the DVCC pin. Leave this pin unconnected to enable the internal supply. See the AD5422 Features section.", 17 CCOMP "Optional compensation capacitor connection for the voltage output buffer. Connecting a 4 nF capacitor between this pin and the VOUT pin allows the voltage output to drive up to 1 礔. It should be noted that the addition of (See Datasheet)", 18 NC "No Connection. Do not connect to these pins.", 19 IOUT (hiz) "Current Output Pin.", 20 BOOST "Optional External Transistor Connection. Connecting an external transistor reduces the power dissipated in the AD5422. See the AD5422 Features section.", 21 VOUT (hiz) "Buffered Analog Output Voltage. The output amplifier is capable of directly driving a 1 k ohm, 2000 pF load.", 22 +VSENSE (in) "Sense connection for the positive voltage output load connection.", 23 -VSENSE (in) "Sense connection for the negative voltage output load connection.", 24 AVDD (power) "Positive Analog Supply Pin. Voltage ranges from 10.8 V to 60 V.", 25 EP "Negative Analog Supply Pin. Voltage ranges from -3 V to -24 V. This paddle can be connected to 0 V if the output voltage range is unipolar. The paddle can be left electrically unconnected provided that a supply connection is (See Datasheet)"

## AD5422BREZ
designator U?
Single 16-Bit Current Source Digital-to-Analog Converter with Serial Interface and HART Connectivity, -40 to +85 degC, RE-24, Pb-Free, Tube; Generic Part Number: AD5422; PartNumber: AD5422BREZ; # DAC Outputs: 1; Max V+: 40V; Op Pwr Diss: 158mW; Resolution (Bits): 16; Settling Time: 18祍; Single Supply: No; DatasheetVersion: Rev.E; PackageVersion: 050806-A; PackageReference: RE-24; PackageDescription: 24-Lead Thin Shrink Small Outline Package, Exposed Pad [TSSOP_EP]; Supplier Part Number 1: AD5422BREZ-ND; Supplier Part Number 2: 2067762; Supplier Part Number 3: 11R1004; Supplier Part Number 4: 584-AD5422BREZ; Packing: Tube; RoHS: Y; Mounting Technology: Surface Mount; Code_JEDEC: MO-153-ADT; ComponentLink1Description: Manufacturer URL; ComponentLink2Description: Datasheet; ComponentLink3Description: Package Specification; ComponentLink4Description: Product URL; ComponentLink5Description: Reference Design URL
footprint TSSOP24_0.65-PAD (Footprint not found)
pins: 1 AVSS (power) "Negative Analog Supply Pin. Voltage ranges from -3 V to -24 V. This pin can be connected to 0 V if the output voltage range is unipolar.", 2 DVCC (power) "Digital Supply Pin. Voltage ranges from 2.7 V to 5.5 V.This pin can also be configured as a 4.5 V LDO output by leaving the DVCC SELECT pin floating.", 3 ~{FAULT} (oc) "Fault Alert. This pin is asserted low when an open circuit is detected in current mode or an overtemperature is detected. Open drain output must be connected to a pull-up resistor.", 4 GND (power) "This pin must be connected to 0 V.", 5 CLEAR SELECT (in) "Selects the voltage output clear value, either zero-scale or midscale code (see Table 21).", 6 CLEAR (in) "Active High Input. Asserting this pin sets the current output to the bottom of the selected range or sets the voltage output to the user selected value (zero-scale or midscale).", 7 LATCH (in) "Positive Edge Sensitive Latch. A rising LATCH edge parallel loads the input shift register data into the DAC register, also updating the output.", 8 SCLK (in) "Serial Clock Input. Data is clocked into the shift register on the rising edge of SCLK. This operates at clock speeds of up to 30 MHz.", 9 SDIN (in) "Serial Data Input. Data must be valid on the rising edge of SCLK.", 10 SDO (hiz) "Serial Data Output. Used to clock data from the serial register in daisy-chain or readback mode. Data is valid on the rising edge of SCLK (see Figure 3 and Figure 4).", 11 GND (power) "Ground Reference Pin.", 12 GND (power) "This pin must be connected to 0 V.", 13 RSET (in) "An external, precision, low drift 15 kohm current setting resistor can be connected to this pin to improve the IOUT temperature drift performance. See the AD5422 Features section.", 14 REFOUT (out) "Internal Reference Voltage Output. REFOUT = 5 V +/- 2 mV.", 15 REFIN (in) "External Reference Voltage Input. Reference input range is 4 V to 5 V. REFIN = 5 V for a specified performance.", 16 DVCC SELECT "When connected to GND, this pin disables the internal supply, and an external supply must be connected to the DVCC pin. Leave this pin unconnected to enable the internal supply. See the AD5422 Features section.", 17 CCOMP "Optional compensation capacitor connection for the voltage output buffer. Connecting a 4 nF capacitor between this pin and the VOUT pin allows the voltage output to drive up to 1 礔. It should be noted that the addition of (See Datasheet)", 18 NC "No Connection. Do not connect to these pins.", 19 IOUT (hiz) "Current Output Pin.", 20 BOOST "Optional External Transistor Connection. Connecting an external transistor reduces the power dissipated in the AD5422. See the AD5422 Features section.", 21 VOUT (hiz) "Buffered Analog Output Voltage. The output amplifier is capable of directly driving a 1 k ohm, 2000 pF load.", 22 +VSENSE (in) "Sense connection for the positive voltage output load connection.", 23 -VSENSE (in) "Sense connection for the negative voltage output load connection.", 24 AVDD (power) "Positive Analog Supply Pin. Voltage ranges from 10.8 V to 60 V.", 25 EP "Negative Analog Supply Pin. Voltage ranges from -3 V to -24 V. This paddle can be connected to 0 V if the output voltage range is unipolar. The paddle can be left electrically unconnected provided that a supply connection is (See Datasheet)"

## AD5424YRU
designator U?
Single 8-Bit High Bandwidth Multiplying Digital-to-Analog Converter, -40 to +125 degC, RU-16, Tube; Generic Part Number: AD5424; PartNumber: AD5424YRU; # DAC Outputs: 1; Max V+: 5.5V; Op Pwr Diss: 25礧; Resolution (Bits): 8; Settling Time: 30ns; Single Supply: Yes; DatasheetVersion: Rev.C; PackageVersion: Nov-2002; PackageReference: RU-16; PackageDescription: 16-Lead Thin Shrink Small Outline Package [TSSOP]; Supplier Part Number 1: AD5424YRU-ND; Supplier Part Number 2: 584-AD5424YRU; Packing: Tube; RoHS: N; Mounting Technology: Surface Mount; Code_JEDEC: MO-153-AB; ComponentLink1Description: Manufacturer URL; ComponentLink2Description: Datasheet; ComponentLink3Description: Package Specification; ComponentLink4Description: Product URL
footprint TSSOP16_0.65 (Footprint not found)
pins: 1 IOUT1 (out) "DAC Current Output.", 2 IOUT2 "DAC Analog Ground. This pin should normally be tied to the analog ground of the system.", 3 GND (power) "Ground.", 4 DB7 (in) "Parallel Data Bits 7.", 5 DB6 (in) "Parallel Data Bits 6.", 6 DB5 (in) "Parallel Data Bits 5.", 7 DB4 (in) "Parallel Data Bits 4.", 8 DB3 (in) "Parallel Data Bits 3.", 9 DB2 (in) "Parallel Data Bits 2.", 10 DB1 (in) "Parallel Data Bits 1.", 11 DB0 (in) "Parallel Data Bits 0.", 12 ~{CS} (in) "Chip Select Input. Active low. Used in conjunction with R/W\ to load parallel data to the input latch or to read data from the DAC register. Rising edge of C\S\ loads data.", 13 R/~{W} (in) "Read/Write. When low, use in conjunction with C\S\ to load parallel data. When high, use with C\S\ to read back contents of DAC register.", 14 VDD (power) "Positive Power Supply Input. These parts can be operated from a supply of 2.5 V to 5.5 V.", 15 VREF (in) "DAC Reference Voltage Input Terminal.", 16 RFB (in) "DAC Feedback Resistor Pin. Establish voltage output for the DAC by connecting to external amplifier output."

## AD5424YRUZ
designator U?
Single 8-Bit High Bandwidth Multiplying Digital-to-Analog Converter, -40 to +125 degC, RU-16, Pb-Free, Tube; Generic Part Number: AD5424; PartNumber: AD5424YRUZ; # DAC Outputs: 1; Max V+: 5.5V; Op Pwr Diss: 25礧; Resolution (Bits): 8; Settling Time: 30ns; Single Supply: Yes; DatasheetVersion: Rev.C; PackageVersion: Nov-2002; PackageReference: RU-16; PackageDescription: 16-Lead Thin Shrink Small Outline Package [TSSOP]; Supplier Part Number 1: AD5424YRUZ-ND; Supplier Part Number 2: 1581918; Supplier Part Number 3: 59K4108; Supplier Part Number 4: 584-AD5424YRUZ; Packing: Tube; RoHS: Y; Mounting Technology: Surface Mount; Code_JEDEC: MO-153-AB; ComponentLink1Description: Manufacturer URL; ComponentLink2Description: Datasheet; ComponentLink3Description: Package Specification; ComponentLink4Description: Product URL
footprint TSSOP16_0.65 (Footprint not found)
pins: 1 IOUT1 (out) "DAC Current Output.", 2 IOUT2 "DAC Analog Ground. This pin should normally be tied to the analog ground of the system.", 3 GND (power) "Ground.", 4 DB7 (in) "Parallel Data Bits 7.", 5 DB6 (in) "Parallel Data Bits 6.", 6 DB5 (in) "Parallel Data Bits 5.", 7 DB4 (in) "Parallel Data Bits 4.", 8 DB3 (in) "Parallel Data Bits 3.", 9 DB2 (in) "Parallel Data Bits 2.", 10 DB1 (in) "Parallel Data Bits 1.", 11 DB0 (in) "Parallel Data Bits 0.", 12 ~{CS} (in) "Chip Select Input. Active low. Used in conjunction with R/W\ to load parallel data to the input latch or to read data from the DAC register. Rising edge of C\S\ loads data.", 13 R/~{W} (in) "Read/Write. When low, use in conjunction with C\S\ to load parallel data. When high, use with C\S\ to read back contents of DAC register.", 14 VDD (power) "Positive Power Supply Input. These parts can be operated from a supply of 2.5 V to 5.5 V.", 15 VREF (in) "DAC Reference Voltage Input Terminal.", 16 RFB (in) "DAC Feedback Resistor Pin. Establish voltage output for the DAC by connecting to external amplifier output."

## AD5425YRM
designator U?
Single 8-Bit High Bandwidth Multiplying Digital-to-Analog Converter, -40 to +125 degC, RM-10, Tube; Generic Part Number: AD5425; PartNumber: AD5425YRM; # DAC Outputs: 1; Max V+: 5.5V; Op Pwr Diss: 25礧; Resolution (Bits): 8; Settling Time: 100ns; Single Supply: Yes; DatasheetVersion: Rev. B; PackageVersion: May-2005; PackageReference: RM-10; PackageDescription: 10-Lead Mini Small Outline Package [MSOP]; Supplier Part Number 1: AD5425YRM-ND; Supplier Part Number 2: 584-AD5425YRM; Packing: Tube; RoHS: N; Mounting Technology: Surface Mount; ComponentLink1Description: Manufacturer URL; ComponentLink2Description: Datasheet; ComponentLink3Description: Package Specification; ComponentLink4Description: Product URL
footprint VSSOP10_0.5 (Footprint not found)
pins: 1 IOUT1 (out) "DAC Current Output.", 2 IOUT2 "DAC Analog Ground. This pin should normally be tied to the analog ground of the system.", 3 GND (power) "Digital Ground Pin.", 4 SCLK (in) "Serial Clock Input. Data is clocked into the input shift register on each falling edge of the serial clock input. This device can accommodate clock rates of up to 50 MHz.", 5 SDIN (in) "Serial Data Input. Data is clocked into the 8-bit input register on each falling edge of the serial clock input.", 6 ~{SYNC} (in) "Active Low Control Input. This is the frame synchronization signal for the input data. When S\Y\N\C\ goes low, it powers on the SCLK and DIN buffers and the input shift register is enabled. Data is transferred on each (See Datasheet)", 7 ~{LDAC} (in) "Load DAC Input. Updates the DAC output. The DAC is updated when this signal goes low or alternatively; if this line is held permanently low, an automatic update mode is selected whereby the DAC is updated after 8 SCLK (See Datasheet)", 8 VDD (power) "Positive Power Supply Input. This part can be operated from a supply of 2.5 V to 5.5 V.", 9 VREF (in) "DAC Reference Voltage Input Terminal.", 10 RFB (in) "DAC Feedback Resistor Pin. Establishes voltage output for the DAC by connecting to external amplifier output."

## AD5426YRM
designator U?
Single 8-Bit High Bandwidth Multiplying Digital-to-Analog Converter, -40 to +125 degC, RM-10, Tube; Generic Part Number: AD5426; PartNumber: AD5426YRM; # DAC Outputs: 1; Max V+: 5.5V; Op Pwr Diss: 25礧; Resolution (Bits): 8; Settling Time: 50ns; Single Supply: Yes; DatasheetVersion: Rev.D; PackageVersion: May-2005; PackageReference: RM-10; PackageDescription: 10-Lead Mini Small Outline Package [MSOP]; Supplier Part Number 1: AD5426YRM-ND; Supplier Part Number 2: 584-AD5426YRM; Packing: Tube; RoHS: N; Mounting Technology: Surface Mount; ComponentLink1Description: Manufacturer URL; ComponentLink2Description: Datasheet; ComponentLink3Description: Package Specification; ComponentLink4Description: Product URL; ComponentLink5Description: Reference Design URL
footprint VSSOP10_0.5 (Footprint not found)
pins: 1 IOUT1 (out) "DAC Current Output.", 2 IOUT2 "DAC Analog Ground. This pin should normally be tied to the analog ground of the system.", 3 GND (power) "Digital Ground Pin.", 4 SCLK (in) "Serial Clock Input. By default, data is clocked into the input shift register on the falling edge of the serial clock input. Alternatively, by means of the serial control bits, the device may be configured such that data is (See Datasheet)", 5 SDIN (in) "Serial Data Input. Data is clocked into the 16-bit input register on the active edge of the serial clock input. By default, on power-up, data is clocked into the shift register on the falling edge of SCLK. The control bits (See Datasheet)", 6 ~{SYNC} (in) "Active Low Control Input. This is the frame synchronization signal for the input data. When S\Y\N\C\ goes low, it powers on the SCLK and DIN buffers, and the input shift register is enabled. Data is loaded to the mode, the (See Datasheet)", 7 SDO (out) "Serial Data Output. This allows a number of parts to be daisy-chained. By default, data is clocked into the shift register on the falling edge and out via SDO on the rising edge of SCLK. Data is always clocked out on the (See Datasheet)", 8 VDD (power) "Positive Power Supply Input. These parts can be operated from a supply of 2.5 V to 5.5 V.", 9 VREF (in) "DAC Reference Voltage Input.", 10 RFB (in) "DAC Feedback Resistor Pin. Establishes voltage output for the DAC by connecting to external amplifier output."

## AD5428YRU
designator U?
Dual 8-Bit High Bandwidth Multiplying Digital-to-Analog Converter, -40 to +125 degC, RU-20, Tube; Generic Part Number: AD5428; PartNumber: AD5428YRU; # DAC Outputs: 2; Max V+: 5.5V; Op Pwr Diss: 3.3礧; Resolution (Bits): 8; Settling Time: 30ns; Single Supply: Yes; DatasheetVersion: Rev.C; PackageVersion: 2000; PackageReference: RU-20; PackageDescription: 20-Lead Thin Shrink Small Outline Package [TSSOP]; Supplier Part Number 1: AD5428YRU-ND; Supplier Part Number 2: 59K4121; Supplier Part Number 3: 584-AD5428YRU; Packing: Tube; RoHS: N; Mounting Technology: Surface Mount; Code_JEDEC: MO-153AC; ComponentLink1Description: Manufacturer URL; ComponentLink2Description: Datasheet; ComponentLink3Description: Package Specification; ComponentLink4Description: Product URL
footprint TSSOP20_0.65 (Footprint not found)
pins: 1 AGND (power) "DAC Ground Pin. This pin should typically be tied to the analog ground of the system, but can be biased to achieve single-supply operation.", 2 IOUTA (out) "DAC Current Outputs.", 3 RFBA (in) "DAC Feedback Resistor Pins. These pins establish voltage output for the DAC by connecting to an external amplifier output.", 4 VREFA (in) "DAC Reference Voltage Input Terminals.", 5 DGND (power) "Digital Ground Pin.", 6 DAC ~{A}/B (in) "Selects DAC A or DAC B. Low selects DAC A; high selects DAC B.", 7 DB7 (in) "Parallel Data Bit 7.", 8 DB6 (in) "Parallel Data Bit 6.", 9 DB5 (in) "Parallel Data Bit 5.", 10 DB4 (in) "Parallel Data Bit 4.", 11 DB3 (in) "Parallel Data Bit 3.", 12 DB2 (in) "Parallel Data Bit 2.", 13 DB1 (in) "Parallel Data Bit 1.", 14 DB0 (in) "Parallel Data Bit 0.", 15 ~{CS} (in) "Chip Select Input. Active low. Used in conjunction with R/W\ to load parallel data to the input latch or to read data from the DAC register.", 16 R/~{W} (in) "Read/Write. When low, used in conjunction with C\S\ to load parallel data. When high, used in conjunction with C\S\ to read back contents of the DAC register.", 17 VDD (power) "Positive Power Supply Input. This part can be operated from a supply of 2.5 V to 5.5 V.", 18 VREFB (in) "DAC Reference Voltage Input Terminals.", 19 RFBB (in) "DAC Feedback Resistor Pins. These pins establish voltage output for the DAC by connecting to an external amplifier output.", 20 IOUTB (out) "DAC Current Outputs."